# Altium footprint library 接插件封装库.PcbLib: 112 footprints (part 1 of 7)
Each footprint in its own frame and in the unit in brackets; x right, y up, seen from the top. Pads: shape width x height; smd on the part's side, far side on the other; paste and mask are expansions set on the pad; w line width, h text height; cw(c..) or ccw(c..) is an arc to the next point about the centre after c.
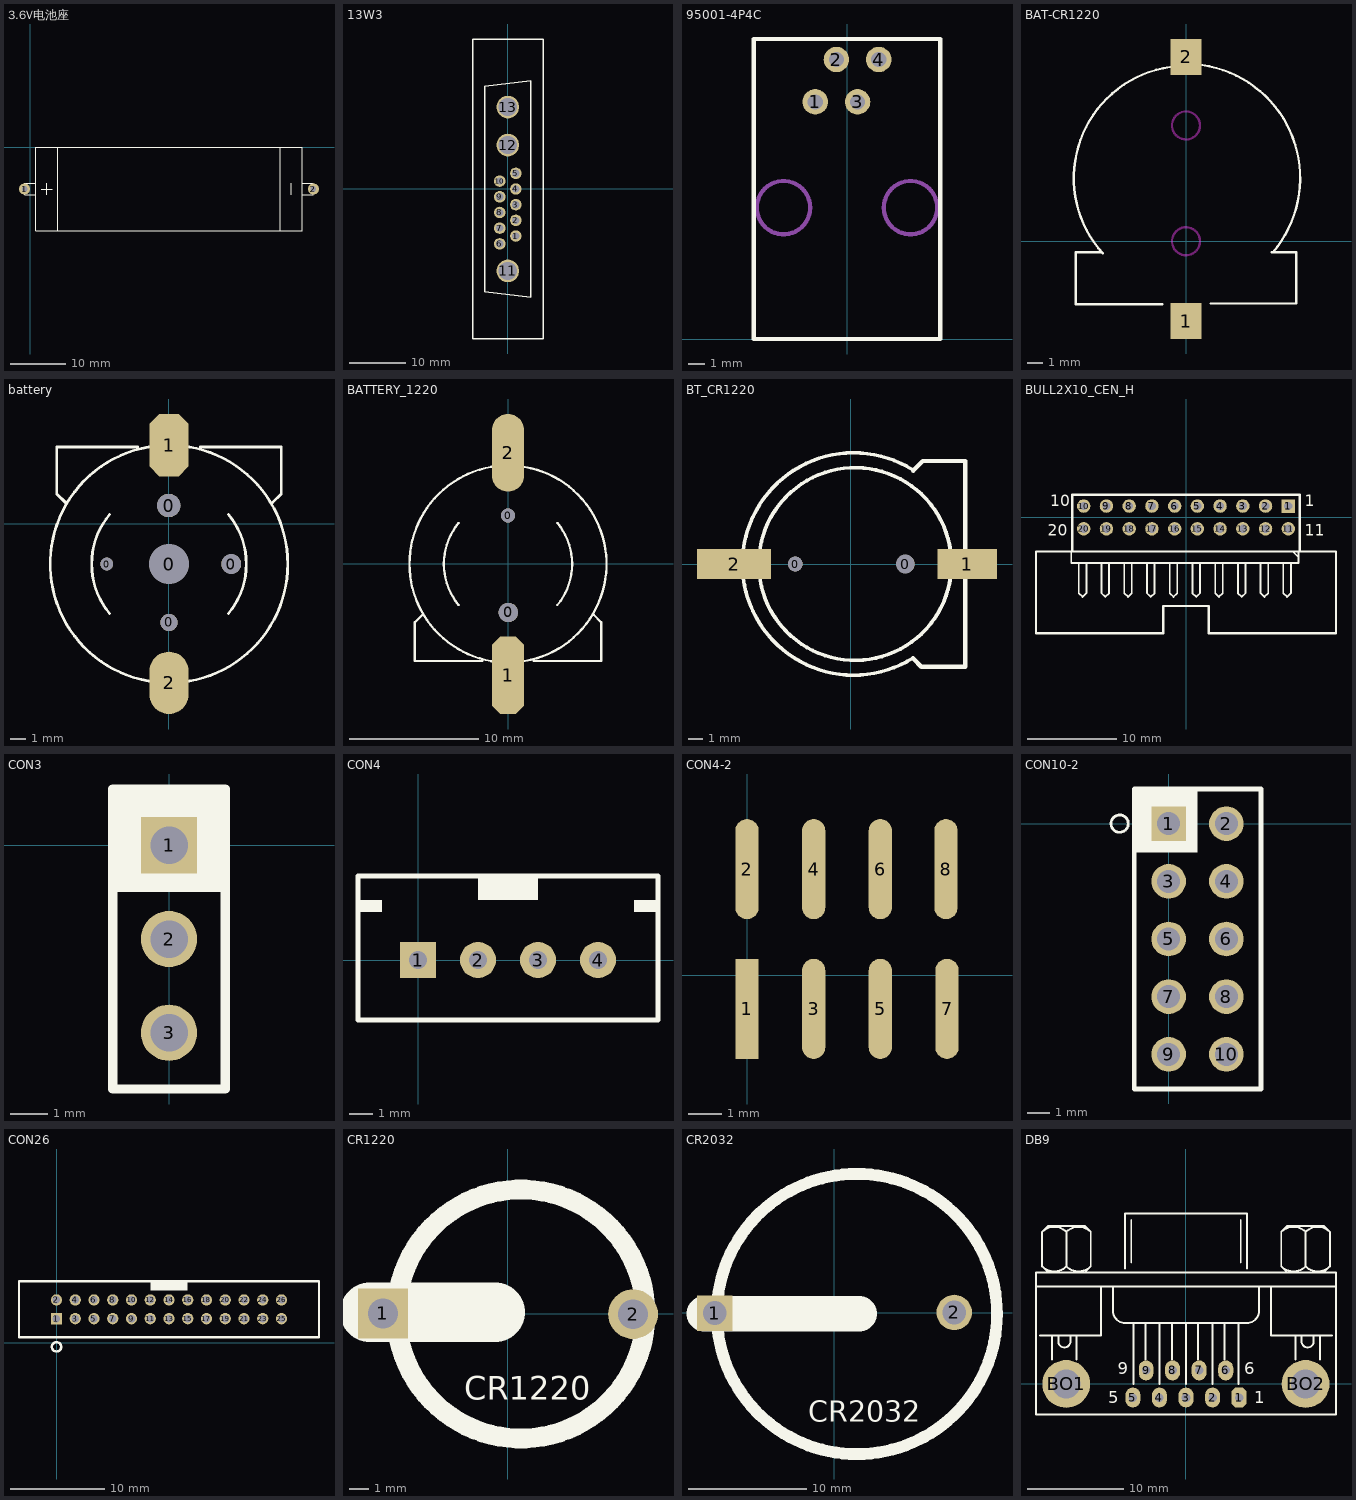
[diagram p0: the footprints below, top view; thin cyan lines are the x and y axes]

## 3.6V电池座 [mm]
pads (2):
  round 2 hole 1: 1(-1,-7.5) 2(51,-7.5)
Top Overlay:
  lines w0.2: 1,-8.5 -1,-8.5 -1,-7.5 -1,-6.5 1,-6.5 ; 2,-7.5 4,-7.5 ; 3,-8.5 3,-6.5 ; 5,-15 5,0 ; 45,-15 45,0 ; 47,-8.5 47,-6.5 ; 49,-8.5 51,-8.5 ; 49,-6.5 51,-6.5 ; 51,-8.45 51,-8.5 ; 51,-6.65 51,-6.5 ; 51,-8.5 51,-7.5 51,-6.5 ; 1,-15 49,-15 49,0 1,0 1,-15

## 13W3 [mm]
pads (13):
  round 2.032 hole 1.27: 1(1.42,-8.31) 2(1.42,-5.54) 3(1.42,-2.77) 4(1.42,0) 5(1.42,2.77) 6(-1.42,-9.69) 7(-1.42,-6.92) 8(-1.42,-4.15) 9(-1.42,-1.38) 10(-1.42,1.39)
  round 4 hole 3.2: 11(0,-14.48) 12(0,7.77) 13(0,14.48)
Top Overlay:
  lines w0.254: -6.223,-26.51 -6.223,26.51 6.3,26.51 6.3,-26.51 -6.223,-26.51 ; -4.1,-18.2 4.1,-19.1 4.1,19.1 -4.1,18.2 -4.1,-18.2
3D body: height 13, standoff -4.2, extent -6.299,-26.495 6.251,26.545

## 95001-4P4C [mil] "RJ11电话插座、90度、黑色、母座"
height 458.66
pads (4):
  round 60 hole 35.43: 1(-75,560.24) 2(-25,660.24) 3(25,560.24) 4(75,660.24)
Top Overlay:
  lines w10: -220.08,0 -220.08,708.66 220.08,708.66 220.08,0 -220.08,0
Mechanical 1:
  circle w10: c150,310.24 r62.99
  circle w10: c-150,310.24 r62.99

## BAT-CR1220 [mm]
pads (2):
  rect 2x2.3 smd: 1(0,-5.138) 2(0,11.862)
Top Overlay:
  lines w0.15: -5.342,-0.793 cw(c0,4.064) -1.021,11.211 ; 1.039,11.335 cw(c0,4.064) 5.588,-0.702
  lines w0.152: -7.112,-4.064 -1.524,-4.064 ; -7.1,-4 -7.1,-0.702 -5.5,-0.702 ; 1.588,-4 7.1,-4 7.1,-0.702 ; 5.5,-0.702 7.112,-0.702
Keep-Out Layer:
  circle w0.15: c0,7.45 r0.9
  circle w0.15: c0,0 r0.9
3D body: height 4.44, standoff -0.5, extent -7.631,-5.44 7.366,13.06

## battery [mm]
pads (7):
  round 0.813 hole 0.813: 0(-3.979,-2.576)
  round 1.5 hole 1.5: 0(-0.016,1.174)
  round 1.1 hole 1.1: 0(0.009,-6.326)
  round 2.54 hole 2.54: 0(0.009,-2.576)
  round 1.27 hole 1.27: 0(3.997,-2.576)
  oct 2.5x4 smd: 1(0.009,5.044)
  oval 2.5x4 smd: 2(0.009,-10.196)
Top Overlay:
  lines w0.178: -6.616,1.349 -7.191,1.924 -7.191,4.924 -1.991,4.924 ; -3.803,-5.748 cw(c0.009,-2.576) -3.801,0.599 ; -0.824,-10.15 cw(c0.009,-2.576) -0.824,4.999 ; 0.842,-10.15 ccw(c0.009,-2.576) 7.629,-2.576 ccw(c0.009,-2.576) 0.842,4.999 ; 2.009,4.924 7.209,4.924 7.209,1.924 6.609,1.324 ; 3.821,-5.748 ccw(c0.009,-2.576) 3.824,0.594

## BATTERY_1220 [mm]
height 1.99
pads (4):
  round 1.1 hole 1.1 unplated: 0(0,3.748)
  round 1.5 hole 1.5 unplated: 0(0.025,-3.752)
  oct 2.5x6 smd: 1(0,-8.602)
  oval 2.5x6 smd: 2(0,8.598)
Top Overlay:
  lines w0.178: -6.6,-3.902 -7.2,-4.502 -7.2,-7.502 -2,-7.502 ; -3.815,-3.171 cw(c0,-0.002) -3.812,3.171 ; -0.833,-7.576 cw(c0,-0.002) -7.62,-0.002 cw(c0,-0.002) -0.833,7.573 ; 0.833,-7.576 ccw(c0,-0.002) 0.833,7.573 ; 2,-7.502 7.2,-7.502 7.2,-4.502 6.625,-3.927 ; 3.81,-3.177 ccw(c0,-0.002) 3.812,3.171
3D body: height 2, standoff 0, extent -7.2,-7.502 7.2,-3.9
3D body: height 0.3, standoff 0, extent -1.1,-11 1.1,-7.6
3D body: height 0.3, standoff 0, extent -0.9,7.6 0.9,10.4
3D body: height 2, standoff 0, extent -7.54,-7.57 7.6,7.6

## BT_CR1220 [mil]
pads (4):
  round 40 hole 40: 0(-149.61,0)
  round 50 hole 50: 0(147.87,0)
  rect 160x80 smd: 1(314.96,0)
  rect 200x80 smd: 2(-314.96,0)
Top Overlay:
  circle w10: c11.81,0 r260.11
  lines w10: 167.81,254.01 ccw(c7.87,0) 168.01,-253.88
  lines w12: 168.32,251.97 194.4,278.04 309.54,278.04 309.54,0 309.54,-277.07 190.46,-277.07 169.29,-255.91
3D body: height 158.08, standoff -36.4, extent -356.38,-295.69 371.97,294.74

## BULL2X10_CEN_H [mm] "Connector; Header; 10x2 Position"
pads (20):
  rect 1.5x1.5 hole 0.9: 1(11.43,1.27)
  round 1.5 hole 0.9: 2(8.89,1.27) 3(6.35,1.27) 4(3.81,1.27) 5(1.27,1.27) 6(-1.27,1.27) 7(-3.81,1.27) 8(-6.35,1.27) 9(-8.89,1.27) 10(-11.43,1.27) 11(11.43,-1.27) 12(8.89,-1.27) 13(6.35,-1.27) 14(3.81,-1.27) 15(1.27,-1.27) 16(-1.27,-1.27) 17(-3.81,-1.27) 18(-6.35,-1.27) 19(-8.89,-1.27) 20(-11.43,-1.27)
Top Overlay:
  lines w0.2: -11.98,-5.08 -11.98,-8.467 -11.557,-8.89 -11.134,-8.467 -11.134,-5.08 ; -9.44,-5.08 -9.44,-8.467 -9.017,-8.89 -8.594,-8.467 -8.594,-5.08 ; -6.9,-5.08 -6.9,-8.467 -6.477,-8.89 -6.054,-8.467 -6.054,-5.08 ; -4.36,-5.08 -4.36,-8.467 -3.937,-8.89 -3.514,-8.467 -3.514,-5.08 ; -1.82,-5.08 -1.82,-8.467 -1.397,-8.89 -0.974,-8.467 -0.974,-5.08 ; 0.72,-5.08 0.72,-8.467 1.143,-8.89 1.566,-8.467 1.566,-5.08 ; 3.26,-5.08 3.26,-8.467 3.683,-8.89 4.106,-8.467 4.106,-5.08 ; 5.8,-5.08 5.8,-8.467 6.223,-8.89 6.646,-8.467 6.646,-5.08 ; 8.34,-5.08 8.34,-8.467 8.763,-8.89 9.186,-8.467 9.186,-5.08 ; 10.88,-5.08 10.88,-8.467 11.303,-8.89 11.726,-8.467 11.726,-5.08 ; 11.938,-3.81 12.573,-4.445 ; -12.827,-5.08 -12.827,-3.81 12.573,-3.81 12.573,-5.08 -12.827,-5.08
  lines w0.254: -16.764,-12.954 -16.764,-3.81 -12.7,-3.81 -12.7,2.54 12.7,2.54 12.7,-3.556 12.7,-3.81 16.764,-3.81 16.764,-12.954 2.54,-12.954 2.54,-9.906 -2.54,-9.906 -2.54,-12.954 -16.764,-12.954
  text "1" at 13.274,1.27 h1.27
  text "11" at 13.274,-2.032 h1.27
  text "10" at -15.174,1.27 h1.27
  text "20" at -15.428,-2.032 h1.27

## CON3 [mil]
pads (3):
  rect 60x60 hole 40: 1(0,0)
  round 60 hole 40: 2(0,-100) 3(0,-200)
Top Overlay:
  rectangle: -60,-50 60,60
  lines w10: -60,-260 -60,60 60,60 60,-260 -60,-260

## CON4 [mil]
pads (4):
  rect 60x60 hole 30: 1(0,0)
  round 60 hole 30: 2(100,0) 3(200,0) 4(300,0)
Top Overlay:
  region: 200,100 200,140 100,140 100,100
  region: -60,80 -60,100 -100,100 -100,80
  region: 400,80 400,100 360,100 360,80
  lines w8: -100,-100 -100,140 400,140 400,-100 -100,-100

## CON4-2 [mm]
pads (8):
  rect 0.7x3 smd: 1(-0.008,-1.01)
  oval 0.7x3 smd: 2(-0.008,3.181) 3(1.992,-1.01) 4(1.992,3.181) 5(3.992,-1.01) 6(3.992,3.181) 7(5.992,-1.01) 8(5.961,3.181)

## CON10-2 [mil]
pads (10):
  rect 60x60 hole 40: 1(-0.3,0)
  round 60 hole 40: 2(99.7,0) 3(-0.3,-100) 4(99.7,-100) 5(-0.3,-200) 6(99.7,-200) 7(-0.3,-300) 8(99.7,-300) 9(-0.3,-400) 10(99.7,-400)
Top Overlay:
  circle w5: c-85.3,0 r15
  rectangle: -60.3,-50 49.7,60
  lines w8: -60.3,-460 -60.3,60 159.7,60 159.7,-460 -60.3,-460

## CON26 [mm]
pads (26):
  rect 1.2x1.2 hole 0.8: 1(-0.008,2.54)
  round 1.2 hole 0.8: 2(-0.008,4.54) 3(1.992,2.54) 4(1.992,4.54) 5(3.992,2.54) 6(3.992,4.54) 7(5.992,2.54) 8(5.992,4.54) 9(7.992,2.54) 10(7.992,4.54) 11(9.992,2.54) 12(9.992,4.54) 13(11.992,2.54) 14(11.992,4.54) 15(13.992,2.54) 16(13.992,4.54) 17(15.992,2.54) 18(15.992,4.54) 19(17.992,2.54) 20(17.992,4.54) 21(19.992,2.54) 22(19.992,4.54) 23(21.992,2.54) 24(21.992,4.54) 25(23.992,2.54) 26(23.992,4.54)
Top Overlay:
  circle w0.254: c-0.008,-0.46 r0.5
  region: 13.992,5.54 13.992,6.54 11.992,6.54 11.992,5.54
  region: 12,5.54 12,6.54 10,6.54 10,5.54
  lines w0.254: -4.008,0.54 27.992,0.54 27.992,1.54 27.992,5.54 27.992,6.54 -4.008,6.54 -4.008,5.54 -4.008,1.54 -4.008,0.54

## CR1220 [mm] "pin 12mm"
height 2
pads (2):
  rect 2.5x2.5 hole 1.5: 1(-6.285,0.02)
  round 2.5 hole 1.5: 2(6.285,-0.02)
Top Overlay:
  circle w1: c0.654,-0.01 r6.25
  lines w3: -6.955,0.08 -0.635,0.08
  text "CR1220" at -2.205,-4.73 h2
3D body: height 4.2, standoff -3.7, extent -6.445,-6.09 7.255,6.41

## CR2032 [mm] "pin 20mm"
height 3.2
pads (2):
  rect 3x3 hole 2: 1(-10.14,-0.025)
  round 3 hole 2: 2(10.14,0.025)
Top Overlay:
  circle w1: c1.899,-0.105 r11.861
  lines w3: -11.04,-0.075 2.11,-0.075
  text "CR2032" at -2.21,-9.825 h3
3D body: height 4.64, standoff -4.6, extent -13.354,-14.363 15.094,14.085

## DB9 [mil]
pads (11):
  oct 62x82 hole 35: 1(218.75,-55.83)
  oval 62x82 hole 35: 2(109.58,-55.83) 3(0.42,-55.83) 4(-108.75,-55.83) 5(-217.92,-55.83) 6(163.75,55.83) 7(54.58,55.83) 8(-54.58,55.83)
  oval 60x82 hole 35: 9(-163.75,55.83)
  round 196.67 hole 118.33: BO1(-492.08,0) BO2(492.08,0)
Top Overlay:
  lines w8: -616.25,400 617.08,400 ; -599.58,200 -349.58,200 -349.58,400 ; -591.34,483.25 ccw(c-541.25,533.33) -491.16,483.25 ; -591.34,625.09 cw(c-541.25,575) -491.16,625.09 ; -566.25,458.33 -591.25,483.33 -591.25,625 -566.25,650 -416.25,650 -391.25,625 -391.25,483.33 -416.25,458.33 ; -549.58,100 -549.58,200 ; -524.58,200 -524.58,175 ccw(c-499.58,175) -474.58,175 -474.58,200 ; -491.34,483.25 ccw(c-441.25,533.33) -391.16,483.25 ; -491.34,625.09 cw(c-441.25,575) -391.16,625.09 ; -491.25,483.33 -491.25,625 ; -449.58,100 -449.58,200 ; -299.58,400 -299.58,300 ccw(c-249.58,300) -249.58,250 250.42,250 ccw(c250.42,300) 300.42,300 300.42,400 ; -249.58,475 -249.58,700 250.42,700 250.42,475 ; -224.58,500 -224.58,675 ; -216.25,0 -216.25,250 ; -166.25,100 -166.25,250 ; -107.92,0 -107.92,250 ; -57.92,100 -57.92,250 ; 0.42,0 0.42,250 ; 50.42,100 50.42,250 ; 108.75,0 108.75,250 ; 158.75,100 158.75,250 ; 217.08,0 217.08,250 ; 225.42,500 225.42,675 ; 350.42,400 350.42,200 600.42,200 ; 392,483.25 ccw(c442.08,533.33) 492.17,483.25 ; 392,625.09 cw(c442.08,575) 492.17,625.09 ; 417.08,458.33 392.08,483.33 392.08,625 417.08,650 567.08,650 592.08,625 592.08,483.33 567.08,458.33 ; 450.42,100 450.42,200 ; 475.42,200 475.42,175 ccw(c500.42,175) 525.42,175 525.42,200 ; 492,483.25 ccw(c542.08,533.33) 592.17,483.25 ; 492,625.09 cw(c542.08,575) 592.17,625.09 ; 492.08,483.33 492.08,625 ; 550.42,100 550.42,200 ; -616.25,-125 617.08,-125 617.08,458.33 -616.25,458.33 -616.25,-125
  text "6" at 240.42,40 h50
  text "1" at 280.42,-80 h50
  text "5" at -319.58,-80 h50
  text "9" at -279.58,40 h50